# Altium footprint library ALL.PcbLib: 153 footprints (part 7 of 11)
Each footprint in its own frame and in the unit in brackets; x right, y up, seen from the top. Pads: shape width x height; smd on the part's side, far side on the other; paste and mask are expansions set on the pad; w line width, h text height; cw(c..) or ccw(c..) is an arc to the next point about the centre after c.
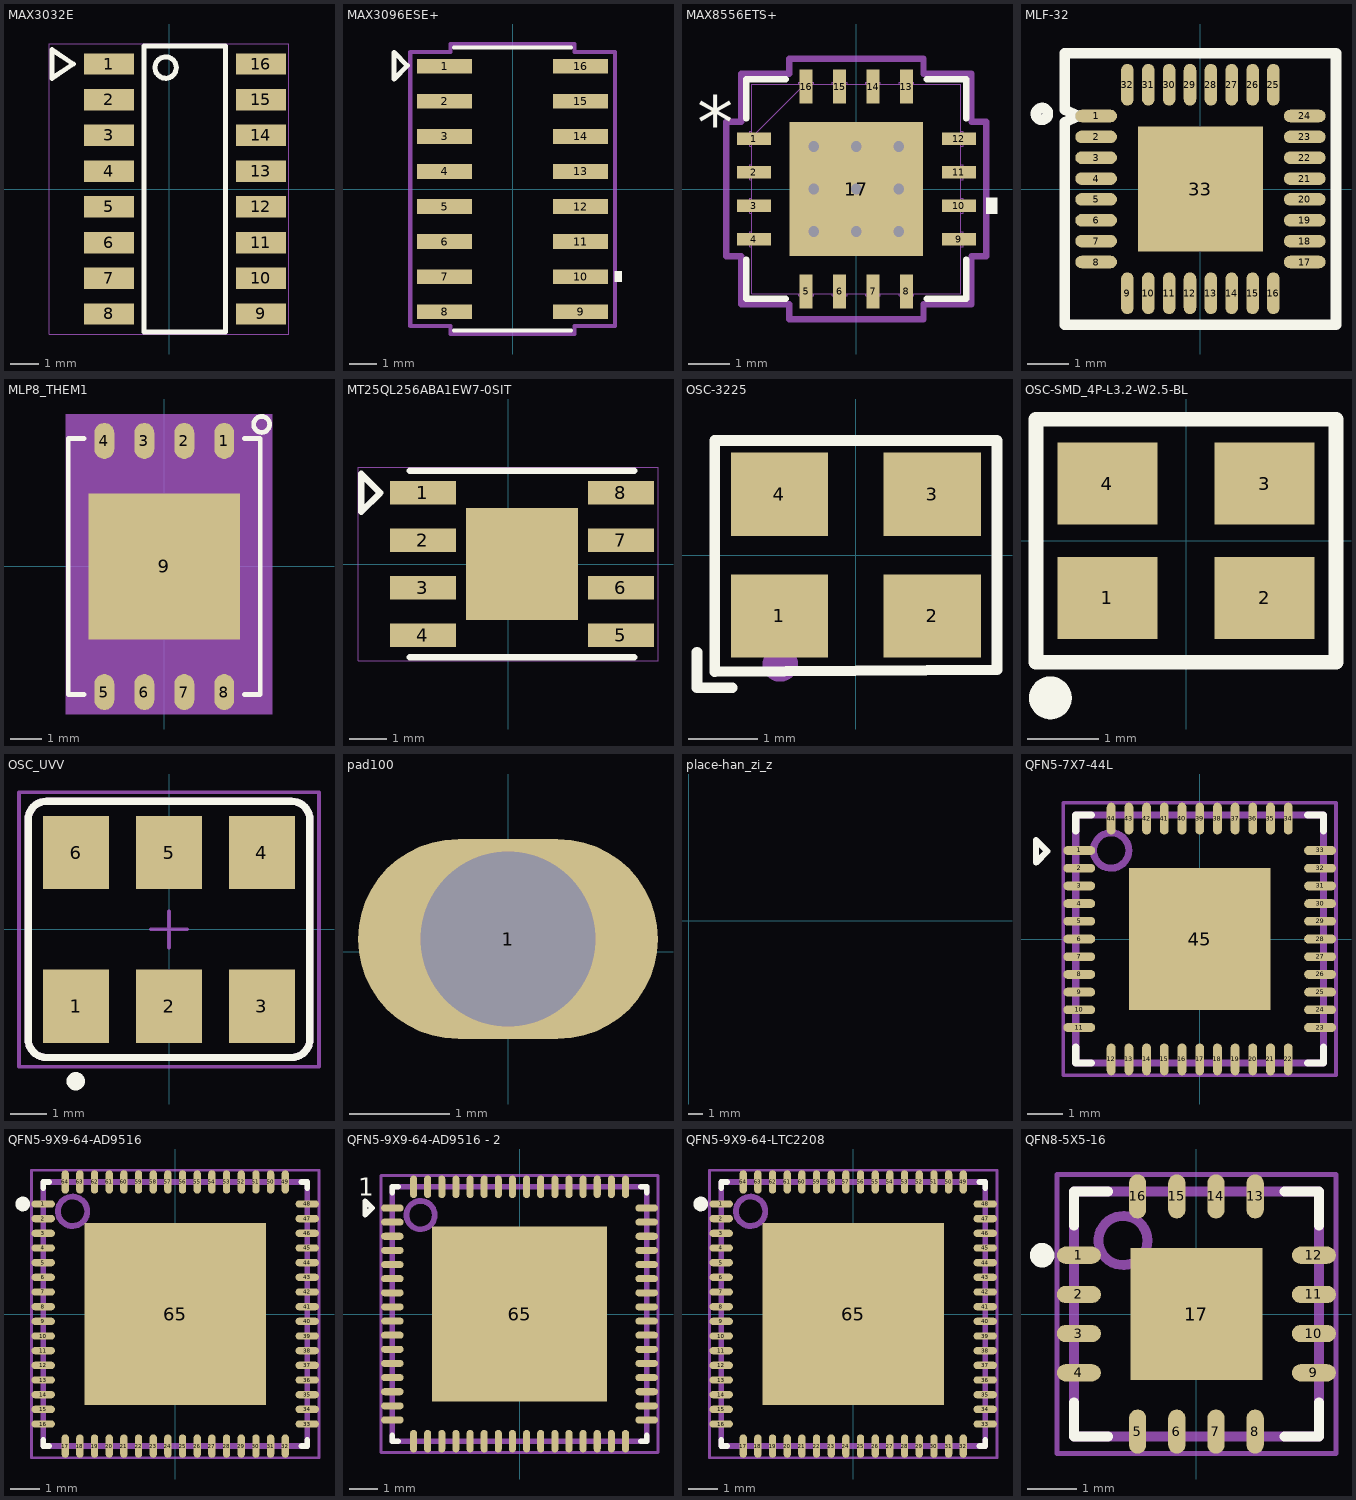
[diagram p6: the footprints below, top view; thin cyan lines are the x and y axes]

## MAX3032E [mil] "MAX3032E"
pads (16):
  rect 70x30 smd: 1(-84.05,175) 2(-84.05,125) 3(-84.05,75) 4(-84.05,25) 5(-84.05,-25) 6(-84.05,-75) 7(-84.05,-125) 8(-84.05,-175) 9(128.55,-175) 10(128.55,-125) 11(128.55,-75) 12(128.55,-25) 13(128.55,25) 14(128.55,75) 15(128.55,125) 16(128.55,175)
Top Overlay:
  circle w7: c-4.72,170 r15
  lines w7: -164.05,155 -164.05,195 -134.05,175 -164.05,155 ; -35.05,-200 -35.05,200 78.8,200 78.8,-200 -35.05,-200
  text ".Designator" at -174.75,79 h30
Mechanical 7:
  lines w1: -167.55,-203.5 -167.55,203.5 167.55,203.5 167.55,-203.5 -167.55,-203.5

## MAX3096ESE+ [mil]
pads (16):
  rect 78x21 smd: 1(-97,175) 2(-97,125) 3(-97,75) 4(-97,25) 5(-97,-25) 6(-97,-75) 7(-97,-125) 8(-97,-175) 9(97,-175) 10(97,-125) 11(97,-75) 12(97,-25) 13(97,25) 14(97,75) 15(97,125) 16(97,175)
Top Overlay:
  region: 146,-117.5 156,-117.5 156,-132.5 146,-132.5
  lines w6: -83.5,-202 83.5,-202 ; -83.5,202 83.5,202
  lines w7: -169,157 -150,176 -169,195 -169,157
Mechanical 15:
  lines w6: -146,-195.5 -88.5,-195.5 -88.5,-207 88.5,-207 88.5,-195.5 146,-195.5 146,195.5 88.5,195.5 88.5,207 -88.5,207 -88.5,195.5 -146,195.5 -146,-195.5

## MAX8556ETS+ [mil]
pads (17):
  rect 32x12 smd paste+0 mask+0: 1(-96.5,47.24) 2(-96.5,15.75) 3(-96.5,-15.75) 4(-96.5,-47.24) 9(96.5,-47.24) 10(96.5,-15.75) 11(96.5,15.75) 12(96.5,47.24)
  rect 12x32 smd paste+0 mask+0: 5(-47.24,-96.5) 6(-15.75,-96.5) 7(15.75,-96.5) 8(47.24,-96.5) 13(47.24,96.5) 14(15.75,96.5) 15(-15.75,96.5) 16(-47.24,96.5)
  rect 126x126 smd paste-62.5 mask+0: 17(0,0)
via 40,0 diameter 18 hole 10
via 40,-40 diameter 18 hole 10
via -40,-40 diameter 18 hole 10
via -40,40 diameter 18 hole 10
via 40,40 diameter 18 hole 10
via -40,0 diameter 18 hole 10
via 0,-40 diameter 18 hole 10
via 0,40 diameter 18 hole 10
via 0,0 diameter 18 hole 10
Top Overlay:
  region: 122.5,-8.25 132.5,-8.25 132.5,-23.25 122.5,-23.25
  lines w6: -103.5,-66.34 -103.5,-103.5 -66.34,-103.5 ; -103.5,66.34 -103.5,103.5 -66.34,103.5 ; 66.34,-103.5 103.5,-103.5 103.5,-66.34 ; 66.34,103.5 103.5,103.5 103.5,66.34
  text "*" at -150,37.99 h50
Top Paste:
  region: -3.94,59.06 -59.06,59.06 -59.06,3.94 -3.94,3.94
  region: -3.94,-3.94 -59.06,-3.94 -59.06,-59.06 -3.94,-59.06
  region: 59.06,59.06 3.94,59.06 3.94,3.94 59.06,3.94
  region: 59.06,-3.94 3.94,-3.94 3.94,-59.06 59.06,-59.06
Mechanical 13:
  lines w1: -98.5,48.5 -48.5,98.5 ; -100.5,-54.24 -100.5,-40.24 -98.5,-40.24 -98.5,-54.24 -100.5,-54.24 ; -100.5,-22.75 -100.5,-8.75 -98.5,-8.75 -98.5,-22.75 -100.5,-22.75 ; -100.5,8.75 -100.5,22.75 -98.5,22.75 -98.5,8.75 -100.5,8.75 ; -100.5,40.24 -100.5,54.24 -98.5,54.24 -98.5,40.24 -100.5,40.24 ; -98.5,-98.5 98.5,-98.5 98.5,98.5 -98.5,98.5 -98.5,-98.5 ; -54.24,-100.5 -54.24,-98.5 -40.24,-98.5 -40.24,-100.5 -54.24,-100.5 ; -54.24,98.5 -40.24,98.5 -40.24,100.5 -54.24,100.5 -54.24,98.5 ; -22.75,-100.5 -22.75,-98.5 -8.75,-98.5 -8.75,-100.5 -22.75,-100.5 ; -22.75,98.5 -8.75,98.5 -8.75,100.5 -22.75,100.5 -22.75,98.5 ; 8.75,-100.5 8.75,-98.5 22.75,-98.5 22.75,-100.5 8.75,-100.5 ; 8.75,98.5 22.75,98.5 22.75,100.5 8.75,100.5 8.75,98.5 ; 40.24,-100.5 40.24,-98.5 54.24,-98.5 54.24,-100.5 40.24,-100.5 ; 40.24,98.5 54.24,98.5 54.24,100.5 40.24,100.5 40.24,98.5 ; 98.5,-54.24 98.5,-40.24 100.5,-40.24 100.5,-54.24 98.5,-54.24 ; 98.5,-22.75 98.5,-8.75 100.5,-8.75 100.5,-22.75 98.5,-22.75 ; 98.5,8.75 98.5,22.75 100.5,22.75 100.5,8.75 98.5,8.75 ; 98.5,40.24 98.5,54.24 100.5,54.24 100.5,40.24 98.5,40.24
  text "*" at -93,37.99 h50
Mechanical 15:
  lines w6: -122.5,-63.24 -108.5,-63.24 -108.5,-108.5 -63.24,-108.5 -63.24,-122.5 63.24,-122.5 63.24,-108.5 108.5,-108.5 108.5,-63.24 122.5,-63.24 122.5,63.24 108.5,63.24 108.5,108.5 63.24,108.5 63.24,122.5 -63.24,122.5 -63.24,108.5 -108.5,108.5 -108.5,63.24 -122.5,63.24 -122.5,-63.24
3D body "21-0140_T1655+3_MXM.step": height 32.09, standoff 0, extent -100.51,-100.51 100.51,100.51

## MLF-32 [mm]
pads (33):
  oval 1x0.3 smd: 1(-2.5,1.75) 2(-2.5,1.25) 3(-2.5,0.75) 4(-2.5,0.25) 5(-2.5,-0.25) 6(-2.5,-0.75) 7(-2.5,-1.25) 8(-2.5,-1.75) 17(2.5,-1.75) 18(2.5,-1.25) 19(2.5,-0.75) 20(2.5,-0.25) 21(2.5,0.25) 22(2.5,0.75) 23(2.5,1.25) 24(2.5,1.75)
  oval 0.3x1 smd: 9(-1.75,-2.5) 10(-1.25,-2.5) 11(-0.75,-2.5) 12(-0.25,-2.5) 13(0.25,-2.5) 14(0.75,-2.5) 15(1.25,-2.5) 16(1.75,-2.5) 25(1.75,2.5) 26(1.25,2.5) 27(0.75,2.5) 28(0.25,2.5) 29(-0.25,2.5) 30(-0.75,2.5) 31(-1.25,2.5) 32(-1.75,2.5)
  rect 3x3 smd: 33(0,0)
Top Overlay:
  circle w0.254: c-3.8,1.8 r0.141
  lines w0.254: -3.25,-3.25 -3.25,1.6 -2.95,1.75 -3.25,1.9 -3.25,3.25 3.25,3.25 3.25,-3.25 -3.25,-3.25

## MLP8_THEM1 [mil] "MLP8_THEM1"
pads (9):
  oval 25x45 smd: 1(75,157) 2(25,157) 3(-25,157) 4(-75,157) 5(-75,-157) 6(-25,-157) 7(25,-157) 8(75,-157)
  rect 188.98x183.07 smd: 9(0,0)
Top Overlay:
  lines w6: -100,-160 -120,-160 -120,160 -100,160 ; 100,-160 120,-160 120,160 100,160 ; 111.81,177.66 ccw(c121.81,177.66) 121.81,167.66 ccw(c121.81,177.66) 131.81,177.66 ccw(c121.81,177.66) 121.81,187.66 ccw(c121.81,177.66) 111.81,177.66
Mechanical 5:
  lines w6: -100,-160 -120,-160 -120,160 -100,160 ; 100,-160 120,-160 120,160 100,160 ; 111.81,177.66 cw(c121.81,177.66) 121.81,187.66 cw(c121.81,177.66) 131.81,177.66 cw(c121.81,177.66) 121.81,167.66 cw(c121.81,177.66) 111.81,177.66
Mechanical 14:
  text "9" at 0,-20 h25
  text "4" at -75,153 h10
  text "6" at -25,-161 h10
  text "2" at 25,153 h10
  text "7" at 25,-161 h10
  text "5" at -75,-161 h10
  text "1" at 75,153 h10
  text "3" at -25,153 h10
  text "8" at 75,-161 h10
Mechanical 16:
  region: -123,-184.5 134.81,-184.5 134.81,190.66 -123,190.66
  lines w6: -100,-160 -120,-160 -120,160 -100,160 ; 100,-160 120,-160 120,160 100,160
Mechanical 17:
  text ".Designator" at -10,-10 h31.1
  text "MT25QU256ABA1EW9-0SIT" at -100,-60 h25
3D body: height 150, standoff 0, extent -123,-184.5 134.81,190.66

## MT25QL256ABA1EW7-0SIT [mil] "MT25QL256ABA1EW7-0SIT"
pads (9):
  rect 70x25 smd: 1(-89.58,75) 2(-89.58,25) 3(-89.58,-25) 4(-89.58,-75) 5(119.08,-75) 6(119.08,-25) 7(119.08,25) 8(119.08,75)
  rect 118.11x118.11 smd: ""(14.75,0)
Top Overlay:
  lines w7: -103.36,-98.42 132.86,-98.42 ; -103.36,98.43 132.86,98.43 ; -154.58,55 -154.58,95 -134.58,75 -154.58,55
Mechanical 7:
  lines w1: -158.08,-101.92 -158.08,101.93 158.08,101.93 158.08,-101.92 -158.08,-101.92
Mechanical 16:
  text ".Designator" at 14.75,0 h30

## OSC-3225 [mm]
pads (4):
  rect 1.4x1.2 smd: 1(-1.1,-0.875) 2(1.1,-0.875) 3(1.1,0.875) 4(-1.1,0.875)
Top Overlay:
  lines w0.152: -2.286,-1.397 -2.286,-1.905 -1.778,-1.905 ; -2.029,-1.679 2.032,-1.651 2.032,0 2.032,1.651 -2.029,1.651 -2.029,-1.679
Mechanical 15:
  circle w0.254: c-1.088,-1.567 r0.127
  region: -1.738,-0.536 -1.702,-0.536 -1.702,-0.608 -1.738,-0.608
  region: -1.702,-0.536 -1.666,-0.536 -1.666,-0.608 -1.702,-0.608
  region: -1.666,-0.5 -1.63,-0.5 -1.63,-0.608 -1.666,-0.608
  region: -1.63,-0.464 -1.594,-0.464 -1.594,-0.572 -1.63,-0.572
  region: -1.594,-0.464 -1.558,-0.464 -1.558,-1.004 -1.594,-1.004
  region: -1.558,-0.428 -1.522,-0.428 -1.522,-1.004 -1.558,-1.004
  region: -1.522,-0.428 -1.486,-0.428 -1.486,-1.004 -1.522,-1.004
  region: -1.486,-0.428 -1.45,-0.428 -1.45,-1.004 -1.486,-1.004

## OSC-SMD_4P-L3.2-W2.5-BL [mm]
pads (4):
  rect 1.4x1.15 smd: 1(-1.1,-0.8) 2(1.1,-0.8) 3(1.1,0.8) 4(-1.1,0.8)
Top Overlay:
  lines w0.203: -2.1,-1.7 2.1,-1.7 2.1,1.7 -2.1,1.7 -2.1,-1.7
  lines w0.3: -1.9,-2.05 ccw(c-1.899,-2.2) -1.897,-2.05

## OSC_UVV [mm]
pads (6):
  rect 1.8x2 smd: 1(-2.54,-2.1) 2(0,-2.1) 3(2.54,-2.1) 4(2.54,2.1) 5(0,2.1) 6(-2.54,2.1)
Top Overlay:
  circle w0.25: c-2.55,-4.15 r0.125
  lines w0.2: -3.85,-3 ccw(c-3.35,-3) -3.35,-3.5 3.35,-3.5 ccw(c3.35,-3) 3.85,-3 3.85,3 ccw(c3.35,3) 3.35,3.5 -3.35,3.5 ccw(c-3.35,3) -3.85,3 -3.85,-3
Mechanical 1:
  lines w0.2: -3.85,-3 ccw(c-3.35,-3) -3.35,-3.5 3.35,-3.5 ccw(c3.35,-3) 3.85,-3 3.85,3 ccw(c3.35,3) 3.35,3.5 -3.35,3.5 ccw(c-3.35,3) -3.85,3 -3.85,-3
  text "U56" at -1.226,-0.5 h1
Mechanical 8:
  lines w0.1: -0.5,0 0.5,0 ; 0,-0.5 0,0.5 ; -4.1,-3.75 -4.1,3.75 4.1,3.75 4.1,-3.75 -4.1,-3.75

## pad100 [mm]
pads (1):
  oval 3x2 hole 1.75: 1(0,0.127)

## place-han_zi_z [mm]
Drill Drawing:
  drawing of 919 lines, arcs and shapes, not listed

## QFN5-7X7-44L [mm]
pads (45):
  oval 0.9x0.25 smd paste-0.1 mask-0.1: 1(-3.4,2.5) 2(-3.4,2) 3(-3.4,1.5) 4(-3.4,1) 5(-3.4,0.5) 6(-3.4,0) 7(-3.4,-0.5) 8(-3.4,-1) 9(-3.4,-1.5) 10(-3.4,-2) 11(-3.4,-2.5) 23(3.4,-2.5) 24(3.4,-2) 25(3.4,-1.5) 26(3.4,-1) 27(3.4,-0.5) 28(3.4,0) 29(3.4,0.5) 30(3.4,1) 31(3.4,1.5) 32(3.4,2) 33(3.4,2.5)
  oval 0.25x0.9 smd paste-0.1 mask-0.1: 12(-2.5,-3.4) 13(-2,-3.4) 14(-1.5,-3.4) 15(-1,-3.4) 16(-0.5,-3.4) 17(0,-3.4) 18(0.5,-3.4) 19(1,-3.4) 20(1.5,-3.4) 21(2,-3.4) 22(2.5,-3.4) 34(2.5,3.4) 35(2,3.4) 36(1.5,3.4) 37(1,3.4) 38(0.5,3.4) 39(0,3.4) 40(-0.5,3.4) 41(-1,3.4) 42(-1.5,3.4) 43(-2,3.4) 44(-2.5,3.4)
  rect 4x4 smd: 45(0,0)
Top Overlay:
  lines w0.178: -4.623,2.159 -4.305,2.476 -4.623,2.794 -4.623,2.54 -4.623,2.159
  lines w0.2: -3.5,-3.05 -3.5,-3.5 -3.05,-3.5 ; -3.5,3.05 -3.5,3.5 -3.05,3.5 ; 3.05,-3.5 3.5,-3.5 3.5,-3.05 ; 3.05,3.5 3.5,3.5 3.5,3.05
Top Paste:
  region: 0.106,0.067 0.12,0.035 2.15,0.649 2.15,1.357
  region: 0.106,-0.068 0.12,-0.036 2.15,-0.649 2.15,-1.399
  region: 0.035,-0.12 0.068,-0.104 1.46,-2.15 0.613,-2.15
  region: -0.036,-0.12 -0.069,-0.104 -1.425,-2.15 -0.649,-2.15
  region: -0.106,-0.067 -0.12,-0.035 -2.15,-0.649 -2.15,-1.357
  region: -0.106,0.068 -0.12,0.036 -2.15,0.649 -2.15,1.399
  region: -0.035,0.12 -0.068,0.104 -1.411,2.15 -0.661,2.15
  region: 0.036,0.12 0.069,0.104 1.412,2.15 0.62,2.15
Mechanical 1:
  circle w0.2: c-2.5,2.5 r0.5
  lines w0.2: -3.5,-3.5 3.5,-3.5 3.5,3.5 -3.5,3.5 -3.5,-3.5
  text "U54" at -1.274,-0.5 h1
Mechanical 8:
  lines w0.1: -0.5,0 0.5,0 ; 0,-0.5 0,0.5 ; -3.85,-3.85 3.85,-3.85 3.85,3.85 -3.85,3.85 -3.85,-3.85

## QFN5-9X9-64-AD9516 [mm]
pads (65):
  oval 0.8x0.25 smd: 1(-4.5,3.75) 2(-4.5,3.25) 3(-4.5,2.75) 4(-4.5,2.25) 5(-4.5,1.75) 6(-4.5,1.25) 7(-4.5,0.75) 8(-4.5,0.25) 9(-4.5,-0.25) 10(-4.5,-0.75) 11(-4.5,-1.25) 12(-4.5,-1.75) 13(-4.5,-2.25) 14(-4.5,-2.75) 15(-4.5,-3.25) 16(-4.5,-3.75) 33(4.5,-3.75) 34(4.5,-3.25) 35(4.5,-2.75) 36(4.5,-2.25) 37(4.5,-1.75) 38(4.5,-1.25) 39(4.5,-0.75) 40(4.5,-0.25) 41(4.5,0.25) 42(4.5,0.75) 43(4.5,1.25) 44(4.5,1.75) 45(4.5,2.25) 46(4.5,2.75) 47(4.5,3.25) 48(4.5,3.75)
  oval 0.25x0.8 smd: 17(-3.75,-4.5) 18(-3.25,-4.5) 19(-2.75,-4.5) 20(-2.25,-4.5) 21(-1.75,-4.5) 22(-1.25,-4.5) 23(-0.75,-4.5) 24(-0.25,-4.5) 25(0.25,-4.5) 26(0.75,-4.5) 27(1.25,-4.5) 28(1.75,-4.5) 29(2.25,-4.5) 30(2.75,-4.5) 31(3.25,-4.5) 32(3.75,-4.5) 49(3.75,4.5) 50(3.25,4.5) 51(2.75,4.5) 52(2.25,4.5) 53(1.75,4.5) 54(1.25,4.5) 55(0.75,4.5) 56(0.25,4.5) 57(-0.25,4.5) 58(-0.75,4.5) 59(-1.25,4.5) 60(-1.75,4.5) 61(-2.25,4.5) 62(-2.75,4.5) 63(-3.25,4.5) 64(-3.75,4.5)
  rect 6.2x6.2 smd: 65(0,0)
Top Overlay:
  circle w0.25: c-5.2,3.75 r0.125
  lines w0.2: -4.5,-4.3 -4.5,-4.5 -4.3,-4.5 ; -4.5,4.3 -4.5,4.5 -4.3,4.5 ; 4.3,-4.5 4.5,-4.5 4.5,-4.3 ; 4.3,4.5 4.5,4.5 4.5,4.3
Top Paste:
  region: -0.106,0.068 -0.12,0.036 -3.7,1.117 -3.7,2.407
  region: -0.035,0.12 -0.068,0.104 -2.428,3.7 -1.139,3.7
  region: 0.036,0.12 0.069,0.104 2.429,3.7 1.067,3.7
  region: 0.106,0.067 0.12,0.035 3.7,1.117 3.7,2.336
  region: 0.106,-0.068 0.12,-0.036 3.7,-1.117 3.7,-2.407
  region: 0.035,-0.12 0.068,-0.104 2.514,-3.7 1.054,-3.7
  region: -0.036,-0.12 -0.069,-0.104 -2.453,-3.7 -1.117,-3.7
  region: -0.106,-0.067 -0.12,-0.035 -3.7,-1.117 -3.7,-2.336
Mechanical 1:
  circle w0.2: c-3.5,3.5 r0.5
  lines w0.2: -4.5,-4.5 4.5,-4.5 4.5,4.5 -4.5,4.5 -4.5,-4.5
  text "U67" at -1.224,-0.5 h1
Mechanical 8:
  lines w0.1: -0.5,0 0.5,0 ; 0,-0.5 0,0.5 ; -4.9,-4.9 4.9,-4.9 4.9,4.9 -4.9,4.9 -4.9,-4.9

## QFN5-9X9-64-AD9516 - 2 [mm]
pads (65):
  oval 0.8x0.25 smd: 1(-4.5,3.75) 2(-4.5,3.25) 3(-4.5,2.75) 4(-4.5,2.25) 5(-4.5,1.75) 6(-4.5,1.25) 7(-4.5,0.75) 8(-4.5,0.25) 9(-4.5,-0.25) 10(-4.5,-0.75) 11(-4.5,-1.25) 12(-4.5,-1.75) 13(-4.5,-2.25) 14(-4.5,-2.75) 15(-4.5,-3.25) 16(-4.5,-3.75) 33(4.5,-3.75) 34(4.5,-3.25) 35(4.5,-2.75) 36(4.5,-2.25) 37(4.5,-1.75) 38(4.5,-1.25) 39(4.5,-0.75) 40(4.5,-0.25) 41(4.5,0.25) 42(4.5,0.75) 43(4.5,1.25) 44(4.5,1.75) 45(4.5,2.25) 46(4.5,2.75) 47(4.5,3.25) 48(4.5,3.75)
  oval 0.25x0.8 smd: 17(-3.75,-4.5) 18(-3.25,-4.5) 19(-2.75,-4.5) 20(-2.25,-4.5) 21(-1.75,-4.5) 22(-1.25,-4.5) 23(-0.75,-4.5) 24(-0.25,-4.5) 25(0.25,-4.5) 26(0.75,-4.5) 27(1.25,-4.5) 28(1.75,-4.5) 29(2.25,-4.5) 30(2.75,-4.5) 31(3.25,-4.5) 32(3.75,-4.5) 49(3.75,4.5) 50(3.25,4.5) 51(2.75,4.5) 52(2.25,4.5) 53(1.75,4.5) 54(1.25,4.5) 55(0.75,4.5) 56(0.25,4.5) 57(-0.25,4.5) 58(-0.75,4.5) 59(-1.25,4.5) 60(-1.75,4.5) 61(-2.25,4.5) 62(-2.75,4.5) 63(-3.25,4.5) 64(-3.75,4.5)
  rect 6.2x6.2 smd: 65(0,0)
Top Overlay:
  lines w0.178: -5.461,3.496 -5.207,3.75 -5.461,4.004 -5.461,3.496
  lines w0.2: -4.5,-4.3 -4.5,-4.5 -4.3,-4.5 ; -4.5,4.3 -4.5,4.5 -4.3,4.5 ; 4.3,-4.5 4.5,-4.5 4.5,-4.3 ; 4.3,4.5 4.5,4.5 4.5,4.3
  text "1" at -5.715,4.191 h0.64
Top Paste:
  region: -0.106,-0.067 -0.12,-0.035 -3.7,-1.117 -3.7,-2.336
  region: -0.036,-0.12 -0.069,-0.104 -2.453,-3.7 -1.117,-3.7
  region: 0.035,-0.12 0.068,-0.104 2.514,-3.7 1.054,-3.7
  region: 0.106,-0.068 0.12,-0.036 3.7,-1.117 3.7,-2.407
  region: 0.106,0.067 0.12,0.035 3.7,1.117 3.7,2.336
  region: 0.036,0.12 0.069,0.104 2.429,3.7 1.067,3.7
  region: -0.035,0.12 -0.068,0.104 -2.428,3.7 -1.139,3.7
  region: -0.106,0.068 -0.12,0.036 -3.7,1.117 -3.7,2.407
Mechanical 1:
  circle w0.2: c-3.5,3.5 r0.5
  lines w0.2: -4.5,-4.5 -4.5,4.5 4.5,4.5 4.5,-4.5 -4.5,-4.5
  text "U67" at -1.224,-0.5 h1
Mechanical 8:
  lines w0.1: -0.5,0 0.5,0 ; 0,-0.5 0,0.5 ; -4.9,-4.9 -4.9,4.9 4.9,4.9 4.9,-4.9 -4.9,-4.9

## QFN5-9X9-64-LTC2208 [mm]
pads (65):
  oval 0.8x0.25 smd: 1(-4.5,3.75) 2(-4.5,3.25) 3(-4.5,2.75) 4(-4.5,2.25) 5(-4.5,1.75) 6(-4.5,1.25) 7(-4.5,0.75) 8(-4.5,0.25) 9(-4.5,-0.25) 10(-4.5,-0.75) 11(-4.5,-1.25) 12(-4.5,-1.75) 13(-4.5,-2.25) 14(-4.5,-2.75) 15(-4.5,-3.25) 16(-4.5,-3.75) 33(4.5,-3.75) 34(4.5,-3.25) 35(4.5,-2.75) 36(4.5,-2.25) 37(4.5,-1.75) 38(4.5,-1.25) 39(4.5,-0.75) 40(4.5,-0.25) 41(4.5,0.25) 42(4.5,0.75) 43(4.5,1.25) 44(4.5,1.75) 45(4.5,2.25) 46(4.5,2.75) 47(4.5,3.25) 48(4.5,3.75)
  oval 0.25x0.8 smd: 17(-3.75,-4.5) 18(-3.25,-4.5) 19(-2.75,-4.5) 20(-2.25,-4.5) 21(-1.75,-4.5) 22(-1.25,-4.5) 23(-0.75,-4.5) 24(-0.25,-4.5) 25(0.25,-4.5) 26(0.75,-4.5) 27(1.25,-4.5) 28(1.75,-4.5) 29(2.25,-4.5) 30(2.75,-4.5) 31(3.25,-4.5) 32(3.75,-4.5) 49(3.75,4.5) 50(3.25,4.5) 51(2.75,4.5) 52(2.25,4.5) 53(1.75,4.5) 54(1.25,4.5) 55(0.75,4.5) 56(0.25,4.5) 57(-0.25,4.5) 58(-0.75,4.5) 59(-1.25,4.5) 60(-1.75,4.5) 61(-2.25,4.5) 62(-2.75,4.5) 63(-3.25,4.5) 64(-3.75,4.5)
  rect 6.2x6.2 smd: 65(0,0)
Top Overlay:
  circle w0.25: c-5.2,3.75 r0.125
  lines w0.2: -4.5,-4.3 -4.5,-4.5 -4.3,-4.5 ; -4.5,4.3 -4.5,4.5 -4.3,4.5 ; 4.3,-4.5 4.5,-4.5 4.5,-4.3 ; 4.3,4.5 4.5,4.5 4.5,4.3
Top Paste:
  region: -0.106,0.068 -0.12,0.036 -3.7,1.117 -3.7,2.407
  region: -0.035,0.12 -0.068,0.104 -2.428,3.7 -1.139,3.7
  region: 0.036,0.12 0.069,0.104 2.429,3.7 1.067,3.7
  region: 0.106,0.067 0.12,0.035 3.7,1.117 3.7,2.336
  region: 0.106,-0.068 0.12,-0.036 3.7,-1.117 3.7,-2.407
  region: 0.035,-0.12 0.068,-0.104 2.514,-3.7 1.054,-3.7
  region: -0.036,-0.12 -0.069,-0.104 -2.453,-3.7 -1.117,-3.7
  region: -0.106,-0.067 -0.12,-0.035 -3.7,-1.117 -3.7,-2.336
Mechanical 1:
  circle w0.2: c-3.5,3.5 r0.5
  lines w0.2: -4.5,-4.5 4.5,-4.5 4.5,4.5 -4.5,4.5 -4.5,-4.5
  text "U20" at -1.25,-0.5 h1
Mechanical 8:
  lines w0.1: -0.5,0 0.5,0 ; 0,-0.5 0,0.5 ; -4.9,-4.9 4.9,-4.9 4.9,4.9 -4.9,4.9 -4.9,-4.9

## QFN8-5X5-16 [mm]
pads (17):
  oval 0.9x0.35 smd paste-0.1 mask-0.1: 1(-2.4,1.2) 2(-2.4,0.4) 3(-2.4,-0.4) 4(-2.4,-1.2) 9(2.4,-1.2) 10(2.4,-0.4) 11(2.4,0.4) 12(2.4,1.2)
  oval 0.35x0.9 smd paste-0.1 mask-0.1: 5(-1.2,-2.4) 6(-0.4,-2.4) 7(0.4,-2.4) 8(1.2,-2.4) 13(1.2,2.4) 14(0.4,2.4) 15(-0.4,2.4) 16(-1.2,2.4)
  rect 2.7x2.7 smd: 17(0,0)
Top Overlay:
  circle w0.25: c-3.15,1.2 r0.125
  lines w0.2: -2.5,-1.8 -2.5,-2.5 -1.8,-2.5 ; -2.5,1.8 -2.5,2.5 -1.8,2.5 ; 1.8,-2.5 2.5,-2.5 2.5,-1.8 ; 1.8,2.5 2.5,2.5 2.5,1.8
Top Paste:
  region: 0.068,0.106 0.036,0.12 0.347,1.15 0.748,1.15
  region: 0.12,0.035 0.104,0.068 1.15,0.78 1.15,0.328
  region: 0.12,-0.036 0.104,-0.069 1.15,-0.762 1.15,-0.347
  region: 0.067,-0.106 0.035,-0.12 0.346,-1.15 0.726,-1.15
  region: -0.068,-0.106 -0.036,-0.12 -0.347,-1.15 -0.748,-1.15
  region: -0.12,-0.035 -0.104,-0.068 -1.15,-0.754 -1.15,-0.353
  region: -0.12,0.036 -0.104,0.069 -1.15,0.755 -1.15,0.333
  region: -0.067,0.106 -0.035,0.12 -0.346,1.15 -0.726,1.15
Mechanical 1:
  circle w0.2: c-1.5,1.5 r0.5
  lines w0.2: -2.5,-2.5 2.5,-2.5 2.5,2.5 -2.5,2.5 -2.5,-2.5
  text "U101" at -1.402,-1.1 h1
Mechanical 8:
  lines w0.1: -0.5,0 0.5,0 ; 0,-0.5 0,0.5 ; -2.85,-2.85 2.85,-2.85 2.85,2.85 -2.85,2.85 -2.85,-2.85